# Altium footprint library Belle_library.PcbLib: 59 footprints (part 4 of 4)
Each footprint in its own frame and in the unit in brackets; x right, y up, seen from the top. Pads: shape width x height; smd on the part's side, far side on the other; paste and mask are expansions set on the pad; w line width, h text height; cw(c..) or ccw(c..) is an arc to the next point about the centre after c.
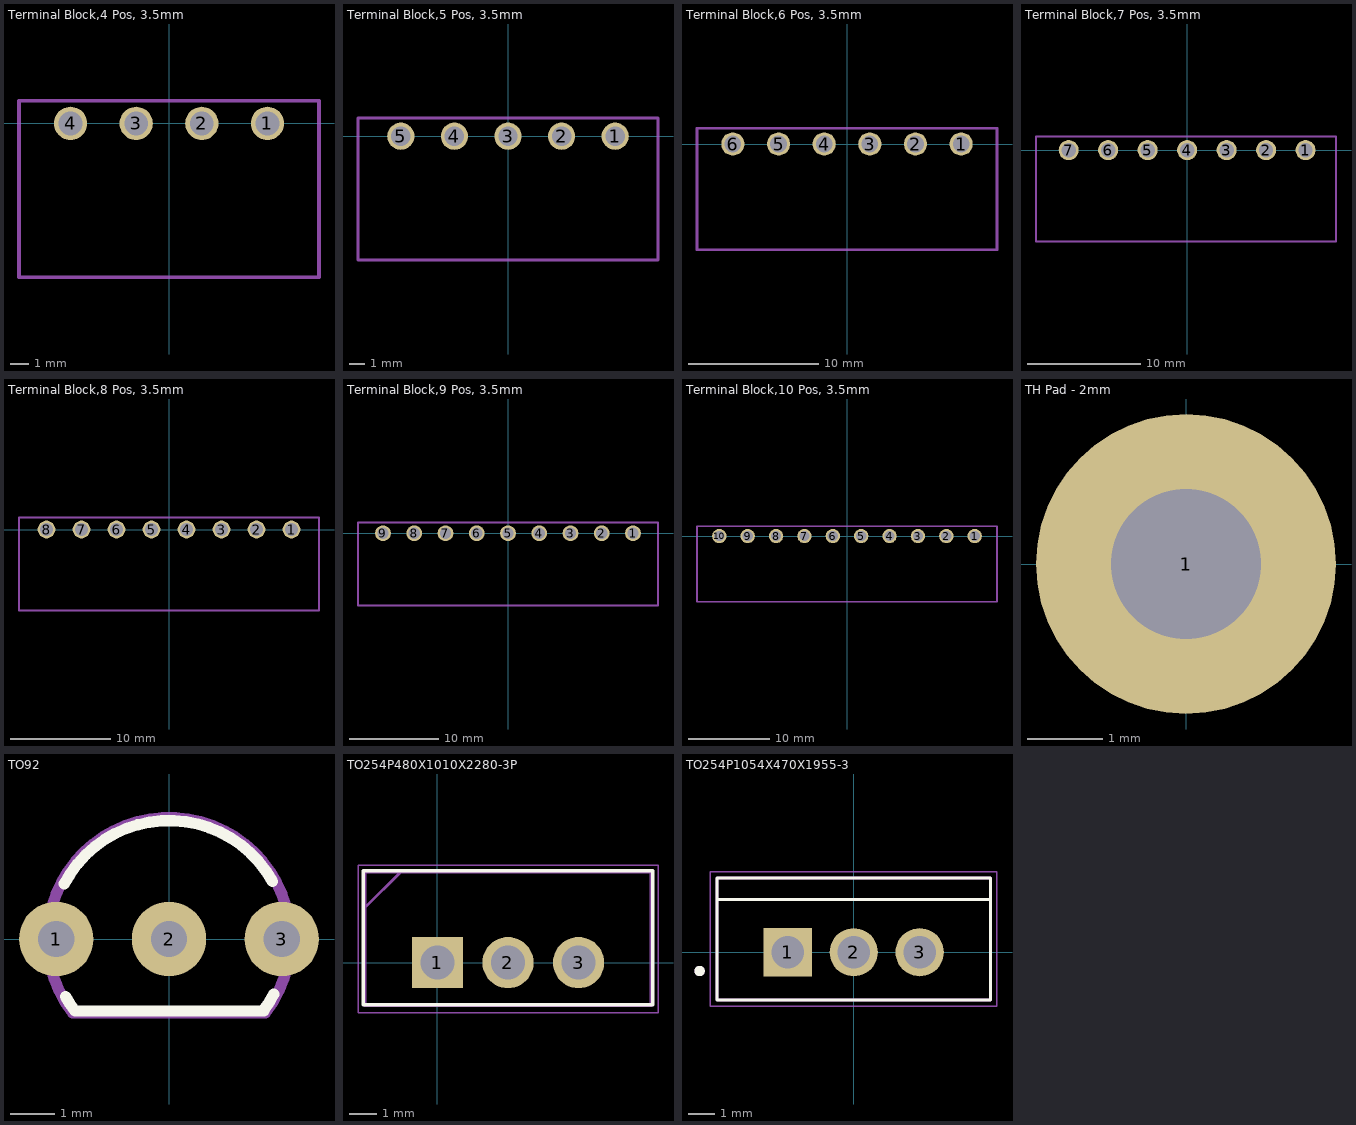
[diagram p3: the footprints below, top view; thin cyan lines are the x and y axes]

## Terminal Block,4 Pos, 3.5mm [mil] "Terminal Block,4 Pos, 3.5mm"
pads (4):
  round 70 hole 50 paste+0 mask+0: 1(206.69,0) 2(68.9,0) 3(-68.9,0) 4(-206.69,0)
Mechanical 1:
  lines w7.8: -314.96,-322.83 314.96,-322.83 314.96,47.24 -314.96,47.24 -314.96,-322.83
3D body "PCB Terminal Blocks, Plug, Wire-to-Board, 4 Position, 3.5mm-M.stp": height 346.46, standoff -90.55, extent -275.59,-669.29 275.59,-59.06
3D body "PCB Terminal Blocks, Plug, Wire-to-Board, 4 Position, 3.5mm-F.stp": height 324.8, standoff -94.49, extent -314.96,-314.96 314.96,47.24

## Terminal Block,5 Pos, 3.5mm [mil] "Terminal Block,5 Pos, 3.5mm"
pads (5):
  round 70 hole 50 paste+0 mask+0: 1(275.59,0) 2(137.8,0) 3(0,0) 4(-137.8,0) 5(-275.59,0)
Mechanical 1:
  lines w7.8: -385.83,-318.9 385.83,-318.9 385.83,47.24 -385.83,47.24 -385.83,-318.9
3D body "PCB Terminal Blocks, Plug, Wire-to-Board, 5 Position, 3.5mm-M.stp": height 346.46, standoff -90.55, extent -344.49,-669.29 344.49,-59.06
3D body "PCB Terminal Blocks, Plug, Wire-to-Board, 5 Position, 3.5mm-F.stp": height 324.8, standoff -94.49, extent -383.86,-314.96 383.86,47.24

## Terminal Block,6 Pos, 3.5mm [mil] "Terminal Block,6 Pos, 3.5mm"
pads (6):
  round 70 hole 50 paste+0 mask+0: 1(344.49,0) 2(206.69,0) 3(68.9,0) 4(-68.9,0) 5(-206.69,0) 6(-344.49,0)
Mechanical 1:
  lines w7.8: -452.76,-318.9 452.76,-318.9 452.76,47.24 -452.76,47.24 -452.76,-318.9
3D body "PCB Terminal Blocks, Plug, Wire-to-Board, 6 Position, 3.5mm-M.stp": height 346.46, standoff -90.55, extent -413.39,-669.29 413.39,-59.06
3D body "PCB Terminal Blocks, Plug, Wire-to-Board, 6 Position, 3.5mm-F.stp": height 324.8, standoff -94.49, extent -452.76,-314.96 452.76,47.24

## Terminal Block,7 Pos, 3.5mm [mil] "Terminal Block,7 Pos, 3.5mm"
pads (7):
  round 70 hole 50 paste+0 mask+0: 1(413.39,0) 2(275.59,0) 3(137.8,0) 4(0,0) 5(-137.8,0) 6(-275.59,0) 7(-413.39,0)
Mechanical 1:
  lines w7.8: -527.56,-318.9 519.68,-318.9 519.68,47.24 -527.56,47.24 -527.56,-318.9
3D body "PCB Terminal Blocks, Plug, Wire-to-Board, 7 Position, 3.5mm-M.stp": height 346.46, standoff -90.55, extent -482.28,-669.29 482.29,-59.06
3D body "PCB Terminal Blocks, Plug, Wire-to-Board, 7 Position, 3.5mm-F.stp": height 324.8, standoff -94.49, extent -521.65,-314.96 521.65,47.24

## Terminal Block,8 Pos, 3.5mm [mil] "Terminal Block,8 Pos, 3.5mm"
pads (8):
  round 70 hole 50 paste+0 mask+0: 1(482.28,0) 2(344.49,0) 3(206.69,0) 4(68.9,0) 5(-68.9,0) 6(-206.69,0) 7(-344.49,0) 8(-482.28,0)
Mechanical 1:
  lines w7.8: -590.55,-318.9 590.55,-318.9 590.55,47.24 -590.55,47.24 -590.55,-318.9
3D body "PCB Terminal Blocks, Plug, Wire-to-Board, 8 Position, 3.5mm-M.stp": height 346.46, standoff -90.55, extent -551.18,-669.29 551.18,-59.06
3D body "PCB Terminal Blocks, Plug, Wire-to-Board, 8 Position, 3.5mm-F.stp": height 324.8, standoff -94.49, extent -590.55,-314.96 590.55,47.24

## Terminal Block,9 Pos, 3.5mm [mil] "Terminal Block,9 Pos, 3.5mm"
pads (9):
  round 70 hole 50 paste+0 mask+0: 1(551.18,0) 2(413.39,0) 3(275.59,0) 4(137.8,0) 5(0,0) 6(-137.8,0) 7(-275.59,0) 8(-413.39,0) 9(-551.18,0)
Mechanical 1:
  lines w7.8: -661.42,-318.9 661.42,-318.9 661.42,47.24 -661.42,47.24 -661.42,-318.9
3D body "PCB Terminal Blocks, Plug, Wire-to-Board, 9 Position, 3.5mm-M.stp": height 346.46, standoff -90.55, extent -620.08,-669.29 620.08,-59.06
3D body "PCB Terminal Blocks, Plug, Wire-to-Board, 9 Position, 3.5mm-F.stp": height 324.8, standoff -94.49, extent -659.45,-314.96 659.45,47.24

## Terminal Block,10 Pos, 3.5mm [mil] "Terminal Block,10 Pos, 3.5mm"
pads (10):
  round 70 hole 50 paste+0 mask+0: 1(620.08,0) 2(482.28,0) 3(344.49,0) 4(206.69,0) 5(68.9,0) 6(-68.9,0) 7(-206.69,0) 8(-344.49,0) 9(-482.28,0) 10(-620.08,0)
Mechanical 1:
  lines w7.8: -728.35,-318.9 728.35,-318.9 728.35,47.24 -728.35,47.24 -728.35,-318.9
3D body "PCB Terminal Blocks, Plug, Wire-to-Board, 10 Position, 3.5mm-M.stp": height 346.46, standoff -90.55, extent -688.98,-669.29 688.98,-59.06
3D body "PCB Terminal Blocks, Plug, Wire-to-Board, 10 Position, 3.5mm-F.stp": height 324.8, standoff -94.49, extent -728.35,-314.96 728.35,47.24

## TH Pad - 2mm [mm]
pads (1):
  round 4 hole 2: 1(0,0)

## TO92 [mil]
pads (3):
  round 66 hole 32: 1(-100,0) 2(0,0) 3(100,0)
Top Overlay:
  lines w10: -92.92,48.9 cw(c0,0) 91.79,50.99 ; -91.79,-50.99 ccw(c0,0) -83.41,-63.78 84,-63.78 ; 84,-63 ccw(c0,0) 92.92,-48.9
Mechanical 13:
  lines w10: -85.55,-65.42 cw(c0,0) 85.55,-65.42 -85.56,-65.42
3D body "to92-3_p2-54_l5_w3-7_h8.stp": height 315.75, standoff -157.48, extent -109.84,-47.48 109.85,98.2

## TO254P480X1010X2280-3P [mm]
pads (3):
  rect 1.845x1.845 hole 1.23: 1(0,0)
  round 1.845 hole 1.23: 2(2.54,0) 3(5.08,0)
Top Overlay:
  lines w0.127: -2.667,-1.524 -2.667,3.302 7.747,3.302 7.747,-1.524 -2.667,-1.524
Mechanical 13:
  lines w0.1: -2.61,1.98 -1.34,3.25 ; -2.61,-1.55 7.69,-1.55 7.69,3.25 -2.61,3.25 -2.61,-1.55
Mechanical 15:
  lines w0.05: -2.86,-1.8 7.94,-1.8 7.94,3.5 -2.86,3.5 -2.86,-1.8
3D body "BA17805T.stp": height 22.1, standoff -16, extent -2.51,-1.55 7.59,3.25

## TO254P1054X470X1955-3 [mm]
pads (3):
  rect 1.86x1.86 hole 1.24: 1(-2.54,0)
  round 1.86 hole 1.24: 2(0,0) 3(2.54,0)
Top Overlay:
  circle w0.2: c-5.94,-0.724 r0.1
  lines w0.127: -5.207,2.032 5.207,2.032 ; -5.27,-1.84 -5.27,2.86 5.27,2.86 5.27,-1.84 -5.27,-1.84
Mechanical 13:
  circle w0.2: c-5.94,-0.724 r0.1
  lines w0.127: -5.27,2.032 5.27,2.032 ; -5.27,-1.84 -5.27,2.86 5.27,2.86 5.27,-1.84 -5.27,-1.84
Mechanical 15:
  lines w0.05: -5.52,-2.09 -5.52,3.11 5.52,3.11 5.52,-2.09 -5.52,-2.09
3D body "transistor_layout.stp": height 19.77, standoff -8.7, extent -4.98,-1.646 5.08,2.794